# Altium footprint library ICs.PcbLib: 86 footprints (part 3 of 6)
Each footprint in its own frame and in the unit in brackets; x right, y up, seen from the top. Pads: shape width x height; smd on the part's side, far side on the other; paste and mask are expansions set on the pad; w line width, h text height; cw(c..) or ccw(c..) is an arc to the next point about the centre after c.
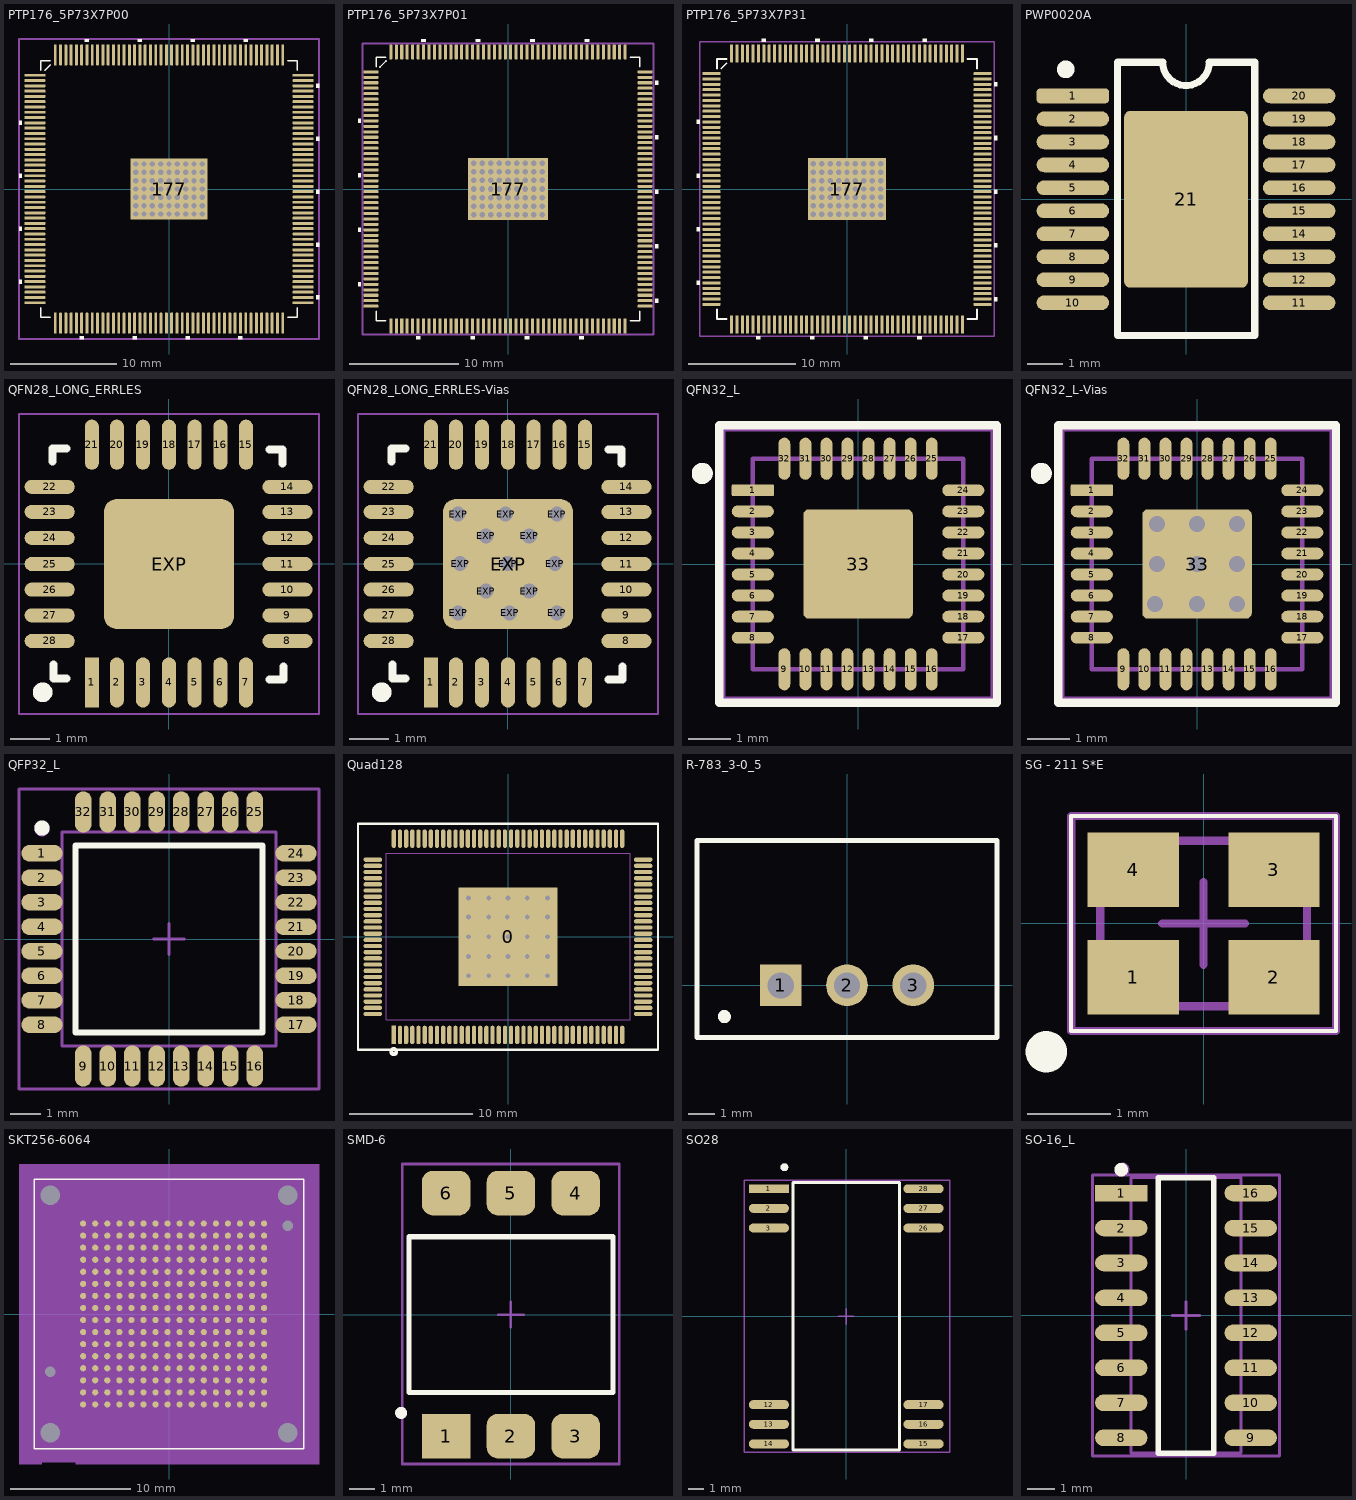
[diagram p2: the footprints below, top view; thin cyan lines are the x and y axes]

## PTP176_5P73X7P00 [mil]
pads (240):
  rect 78x11 smd: 1(-499,423.23)
  rrect50% 78x11 smd: 2(-499,403.54) 3(-499,383.86) 4(-499,364.17) 5(-499,344.49) 6(-499,324.8) 7(-499,305.12) 8(-499,285.43) 9(-499,265.75) 10(-499,246.06) 11(-499,226.38) 12(-499,206.69) 13(-499,187.01) 14(-499,167.32) 15(-499,147.64) 16(-499,127.95) 17(-499,108.27) 18(-499,88.58) 19(-499,68.9) 20(-499,49.21) 21(-499,29.53) 22(-499,9.84) 23(-499,-9.84) 24(-499,-29.53) 25(-499,-49.21) 26(-499,-68.9) 27(-499,-88.58) 28(-499,-108.27) 29(-499,-127.95) 30(-499,-147.64) 31(-499,-167.32) 32(-499,-187.01) 33(-499,-206.69) 34(-499,-226.38) 35(-499,-246.06) 36(-499,-265.75) 37(-499,-285.43) 38(-499,-305.12) 39(-499,-324.8) 40(-499,-344.49) 41(-499,-364.17) 42(-499,-383.86) 43(-499,-403.54) 44(-499,-423.23) 89(499,-423.23) 90(499,-403.54) 91(499,-383.86) 92(499,-364.17) 93(499,-344.49) 94(499,-324.8) 95(499,-305.12) 96(499,-285.43) 97(499,-265.75) 98(499,-246.06) 99(499,-226.38) 100(499,-206.69) 101(499,-187.01) 102(499,-167.32) 103(499,-147.64) 104(499,-127.95) 105(499,-108.27) 106(499,-88.58) 107(499,-68.9) 108(499,-49.21) 109(499,-29.53) 110(499,-9.84) 111(499,9.84) 112(499,29.53) 113(499,49.21) 114(499,68.9) 115(499,88.58) 116(499,108.27) 117(499,127.95) 118(499,147.64) 119(499,167.32) 120(499,187.01) 121(499,206.69) 122(499,226.38) 123(499,246.06) 124(499,265.75) 125(499,285.43) 126(499,305.12) 127(499,324.8) 128(499,344.49) 129(499,364.17) 130(499,383.86) 131(499,403.54) 132(499,423.23)
  rrect50% 11x78 smd: 45(-423.23,-499) 46(-403.54,-499) 47(-383.86,-499) 48(-364.17,-499) 49(-344.49,-499) 50(-324.8,-499) 51(-305.12,-499) 52(-285.43,-499) 53(-265.75,-499) 54(-246.06,-499) 55(-226.38,-499) 56(-206.69,-499) 57(-187.01,-499) 58(-167.32,-499) 59(-147.64,-499) 60(-127.95,-499) 61(-108.27,-499) 62(-88.58,-499) 63(-68.9,-499) 64(-49.21,-499) 65(-29.53,-499) 66(-9.84,-499) 67(9.84,-499) 68(29.53,-499) 69(49.21,-499) 70(68.9,-499) 71(88.58,-499) 72(108.27,-499) 73(127.95,-499) 74(147.64,-499) 75(167.32,-499) 76(187.01,-499) 77(206.69,-499) 78(226.38,-499) 79(246.06,-499) 80(265.75,-499) 81(285.43,-499) 82(305.12,-499) 83(324.8,-499) 84(344.49,-499) 85(364.17,-499) 86(383.86,-499) 87(403.54,-499) 88(423.23,-499) 133(423.23,499) 134(403.54,499) 135(383.86,499) 136(364.17,499) 137(344.49,499) 138(324.8,499) 139(305.12,499) 140(285.43,499) 141(265.75,499) 142(246.06,499) 143(226.38,499) 144(206.69,499) 145(187.01,499) 146(167.32,499) 147(147.64,499) 148(127.95,499) 149(108.27,499) 150(88.58,499) 151(68.9,499) 152(49.21,499) 153(29.53,499) 154(9.84,499) 155(-9.84,499) 156(-29.53,499) 157(-49.21,499) 158(-68.9,499) 159(-88.58,499) 160(-108.27,499) 161(-127.95,499) 162(-147.64,499) 163(-167.32,499) 164(-187.01,499) 165(-206.69,499) 166(-226.38,499) 167(-246.06,499) 168(-265.75,499) 169(-285.43,499) 170(-305.12,499) 171(-324.8,499) 172(-344.49,499) 173(-364.17,499) 174(-383.86,499) 175(-403.54,499) 176(-423.23,499)
  rect 287.8x225.59 smd paste-143.4 mask-143.5: 177(0,0)
  round 20 / inner round 60 / far side round 20 hole 20: V(-124,-93) V(-124,-62) V(-124,-31) V(-124,0) V(-124,31) V(-124,62) V(-124,93) V(-93,-93) V(-93,-62) V(-93,-31) V(-93,0) V(-93,31) V(-93,62) V(-93,93) V(-62,-93) V(-62,-62) V(-62,-31) V(-62,0) V(-62,31) V(-62,62) V(-62,93) V(-31,-93) V(-31,-62) V(-31,-31) V(-31,0) V(-31,31) V(-31,62) V(-31,93) V(0,-93) V(0,-62) V(0,-31) V(0,0) V(0,31) V(0,62) V(0,93) V(31,-93) V(31,-62) V(31,-31) V(31,0) V(31,31) V(31,62) V(31,93) V(62,-93) V(62,-62) V(62,-31) V(62,0) V(62,31) V(62,62) V(62,93) V(93,-93) V(93,-62) V(93,-31) V(93,0) V(93,31) V(93,62) V(93,93) V(124,-93) V(124,-62) V(124,-31) V(124,0) V(124,31) V(124,62) V(124,93)
Top Overlay:
  region: -297.62,548 -312.62,548 -312.62,558 -297.62,558
  region: -100.77,548 -115.77,548 -115.77,558 -100.77,558
  region: 96.08,548 81.08,548 81.08,558 96.08,558
  region: 292.93,548 277.93,548 277.93,558 292.93,558
  region: 548,391.36 558,391.36 558,376.36 548,376.36
  region: 548,194.51 558,194.51 558,179.51 548,179.51
  region: 548,-2.34 558,-2.34 558,-17.34 548,-17.34
  region: 548,-199.19 558,-199.19 558,-214.19 548,-214.19
  region: 548,-396.04 558,-396.04 558,-411.04 548,-411.04
  region: 273.25,-548 258.25,-548 258.25,-558 273.25,-558
  region: 76.4,-548 61.4,-548 61.4,-558 76.4,-558
  region: -120.45,-548 -135.45,-548 -135.45,-558 -120.45,-558
  region: -317.3,-548 -332.3,-548 -332.3,-558 -317.3,-558
  region: -548,-336.99 -558,-336.99 -558,-351.99 -548,-351.99
  region: -548,-140.14 -558,-140.14 -558,-155.14 -548,-155.14
  region: -548,56.71 -558,56.71 -558,41.71 -548,41.71
  region: -548,253.56 -558,253.56 -558,238.56 -548,238.56
  lines w6: -476.5,-441.83 -476.5,-476.5 -441.83,-476.5 ; -476.5,441.83 -476.5,476.5 -441.83,476.5 ; -461.17,441.83 -441.83,461.17 ; 441.83,-476.5 476.5,-476.5 476.5,-441.83 ; 441.83,476.5 476.5,476.5 476.5,441.83
Top Paste:
  drawing of 80 lines, arcs and shapes, not listed
Top Solder:
  region: 131.87,-115.3 131.87,115.3 146.4,115.3 146.4,-115.3
  region: 116.13,-115.3 116.13,115.3 100.87,115.3 100.87,-115.3
  region: 85.13,-115.3 85.13,115.3 69.87,115.3 69.87,-115.3
  region: 54.13,-115.3 54.13,115.3 38.87,115.3 38.87,-115.3
  region: 23.13,-115.3 23.13,115.3 7.87,115.3 7.87,-115.3
  region: -7.87,-115.3 -7.87,115.3 -23.13,115.3 -23.13,-115.3
  region: -38.87,-115.3 -38.87,115.3 -54.13,115.3 -54.13,-115.3
  region: -69.87,-115.3 -69.87,115.3 -85.13,115.3 -85.13,-115.3
  region: -100.87,-115.3 -100.87,115.3 -116.13,115.3 -116.13,-115.3
  region: -146.4,-115.3 -146.4,115.3 -131.87,115.3 -131.87,-115.3
  region: -146.4,-115.3 -146.4,-100.87 146.4,-100.87 146.4,-115.3
  region: -146.4,-85.13 -146.4,-69.87 146.4,-69.87 146.4,-85.13
  region: -146.4,-54.13 -146.4,-38.87 146.4,-38.87 146.4,-54.13
  region: -146.4,-23.13 -146.4,-7.87 146.4,-7.87 146.4,-23.13
  region: -146.4,7.87 -146.4,23.13 146.4,23.13 146.4,7.87
  region: -146.4,38.87 -146.4,54.13 146.4,54.13 146.4,38.87
  region: -146.4,69.87 -146.4,85.13 146.4,85.13 146.4,69.87
  region: -146.4,100.87 -146.4,115.3 146.4,115.3 146.4,100.87
Mechanical 15:
  lines w6: -558,-558 558,-558 558,558 -558,558 -558,-558
3D body "User Library-IPC QFP-full (1).step": height 66.93, standoff 3.94, extent -512.36,-512.36 512.37,512.37

## PTP176_5P73X7P01 [mil]
pads (240):
  rect 54x11 smd: 1(-495,423.23)
  rrect50% 54x11 smd: 2(-495,403.54) 3(-495,383.86) 4(-495,364.17) 5(-495,344.49) 6(-495,324.8) 7(-495,305.12) 8(-495,285.43) 9(-495,265.75) 10(-495,246.06) 11(-495,226.38) 12(-495,206.69) 13(-495,187.01) 14(-495,167.32) 15(-495,147.64) 16(-495,127.95) 17(-495,108.27) 18(-495,88.58) 19(-495,68.9) 20(-495,49.21) 21(-495,29.53) 22(-495,9.84) 23(-495,-9.84) 24(-495,-29.53) 25(-495,-49.21) 26(-495,-68.9) 27(-495,-88.58) 28(-495,-108.27) 29(-495,-127.95) 30(-495,-147.64) 31(-495,-167.32) 32(-495,-187.01) 33(-495,-206.69) 34(-495,-226.38) 35(-495,-246.06) 36(-495,-265.75) 37(-495,-285.43) 38(-495,-305.12) 39(-495,-324.8) 40(-495,-344.49) 41(-495,-364.17) 42(-495,-383.86) 43(-495,-403.54) 44(-495,-423.23) 89(495,-423.23) 90(495,-403.54) 91(495,-383.86) 92(495,-364.17) 93(495,-344.49) 94(495,-324.8) 95(495,-305.12) 96(495,-285.43) 97(495,-265.75) 98(495,-246.06) 99(495,-226.38) 100(495,-206.69) 101(495,-187.01) 102(495,-167.32) 103(495,-147.64) 104(495,-127.95) 105(495,-108.27) 106(495,-88.58) 107(495,-68.9) 108(495,-49.21) 109(495,-29.53) 110(495,-9.84) 111(495,9.84) 112(495,29.53) 113(495,49.21) 114(495,68.9) 115(495,88.58) 116(495,108.27) 117(495,127.95) 118(495,147.64) 119(495,167.32) 120(495,187.01) 121(495,206.69) 122(495,226.38) 123(495,246.06) 124(495,265.75) 125(495,285.43) 126(495,305.12) 127(495,324.8) 128(495,344.49) 129(495,364.17) 130(495,383.86) 131(495,403.54) 132(495,423.23)
  rect 11x54 smd: 45(-423.23,-495) 46(-403.54,-495) 47(-383.86,-495) 48(-364.17,-495) 49(-344.49,-495) 50(-324.8,-495) 51(-305.12,-495) 52(-285.43,-495) 53(-265.75,-495) 54(-246.06,-495) 55(-226.38,-495) 56(-206.69,-495) 57(-187.01,-495) 58(-167.32,-495) 59(-147.64,-495) 60(-127.95,-495) 61(-108.27,-495) 62(-88.58,-495) 63(-68.9,-495) 64(-49.21,-495) 65(-29.53,-495) 66(-9.84,-495) 67(9.84,-495) 68(29.53,-495) 69(49.21,-495) 70(68.9,-495) 71(88.58,-495) 72(108.27,-495) 73(127.95,-495) 74(147.64,-495) 75(167.32,-495) 76(187.01,-495) 77(206.69,-495) 78(226.38,-495) 79(246.06,-495) 80(265.75,-495) 81(285.43,-495) 82(305.12,-495) 83(324.8,-495) 84(344.49,-495) 85(364.17,-495) 86(383.86,-495) 87(403.54,-495) 88(423.23,-495)
  rrect50% 11x54 smd: 133(423.23,495) 134(403.54,495) 135(383.86,495) 136(364.17,495) 137(344.49,495) 138(324.8,495) 139(305.12,495) 140(285.43,495) 141(265.75,495) 142(246.06,495) 143(226.38,495) 144(206.69,495) 145(187.01,495) 146(167.32,495) 147(147.64,495) 148(127.95,495) 149(108.27,495) 150(88.58,495) 151(68.9,495) 152(49.21,495) 153(29.53,495) 154(9.84,495) 155(-9.84,495) 156(-29.53,495) 157(-49.21,495) 158(-68.9,495) 159(-88.58,495) 160(-108.27,495) 161(-127.95,495) 162(-147.64,495) 163(-167.32,495) 164(-187.01,495) 165(-206.69,495) 166(-226.38,495) 167(-246.06,495) 168(-265.75,495) 169(-285.43,495) 170(-305.12,495) 171(-324.8,495) 172(-344.49,495) 173(-364.17,495) 174(-383.86,495) 175(-403.54,495) 176(-423.23,495)
  rect 287.8x225.59 smd paste-143.4 mask-143.5: 177(0,0)
  round 20 / inner round 60 / far side round 20 hole 20: V(-124,-93) V(-124,-62) V(-124,-31) V(-124,0) V(-124,31) V(-124,62) V(-124,93) V(-93,-93) V(-93,-62) V(-93,-31) V(-93,0) V(-93,31) V(-93,62) V(-93,93) V(-62,-93) V(-62,-62) V(-62,-31) V(-62,0) V(-62,31) V(-62,62) V(-62,93) V(-31,-93) V(-31,-62) V(-31,-31) V(-31,0) V(-31,31) V(-31,62) V(-31,93) V(0,-93) V(0,-62) V(0,-31) V(0,0) V(0,31) V(0,62) V(0,93) V(31,-93) V(31,-62) V(31,-31) V(31,0) V(31,31) V(31,62) V(31,93) V(62,-93) V(62,-62) V(62,-31) V(62,0) V(62,31) V(62,62) V(62,93) V(93,-93) V(93,-62) V(93,-31) V(93,0) V(93,31) V(93,62) V(93,93) V(124,-93) V(124,-62) V(124,-31) V(124,0) V(124,31) V(124,62) V(124,93)
Top Overlay:
  region: -297.62,532 -312.62,532 -312.62,542 -297.62,542
  region: -100.77,532 -115.77,532 -115.77,542 -100.77,542
  region: 96.08,532 81.08,532 81.08,542 96.08,542
  region: 292.93,532 277.93,532 277.93,542 292.93,542
  region: 532,391.36 542,391.36 542,376.36 532,376.36
  region: 532,194.51 542,194.51 542,179.51 532,179.51
  region: 532,-2.34 542,-2.34 542,-17.34 532,-17.34
  region: 532,-199.19 542,-199.19 542,-214.19 532,-214.19
  region: 532,-396.04 542,-396.04 542,-411.04 532,-411.04
  region: 273.25,-532 258.25,-532 258.25,-542 273.25,-542
  region: 76.4,-532 61.4,-532 61.4,-542 76.4,-542
  region: -120.45,-532 -135.45,-532 -135.45,-542 -120.45,-542
  region: -317.3,-532 -332.3,-532 -332.3,-542 -317.3,-542
  region: -532,-336.99 -542,-336.99 -542,-351.99 -532,-351.99
  region: -532,-140.14 -542,-140.14 -542,-155.14 -532,-155.14
  region: -532,56.71 -542,56.71 -542,41.71 -532,41.71
  region: -532,253.56 -542,253.56 -542,238.56 -532,238.56
  lines w6: -476.5,-441.83 -476.5,-476.5 -441.83,-476.5 ; -476.5,441.83 -476.5,476.5 -441.83,476.5 ; -462.42,440.58 -440.58,462.42 ; 441.83,-476.5 476.5,-476.5 476.5,-441.83 ; 441.83,476.5 476.5,476.5 476.5,441.83
Top Paste:
  drawing of 80 lines, arcs and shapes, not listed
Top Solder:
  region: 131.87,-115.3 131.87,115.3 146.4,115.3 146.4,-115.3
  region: 116.13,-115.3 116.13,115.3 100.87,115.3 100.87,-115.3
  region: 85.13,-115.3 85.13,115.3 69.87,115.3 69.87,-115.3
  region: 54.13,-115.3 54.13,115.3 38.87,115.3 38.87,-115.3
  region: 23.13,-115.3 23.13,115.3 7.87,115.3 7.87,-115.3
  region: -7.87,-115.3 -7.87,115.3 -23.13,115.3 -23.13,-115.3
  region: -38.87,-115.3 -38.87,115.3 -54.13,115.3 -54.13,-115.3
  region: -69.87,-115.3 -69.87,115.3 -85.13,115.3 -85.13,-115.3
  region: -100.87,-115.3 -100.87,115.3 -116.13,115.3 -116.13,-115.3
  region: -146.4,-115.3 -146.4,115.3 -131.87,115.3 -131.87,-115.3
  region: -146.4,-115.3 -146.4,-100.87 146.4,-100.87 146.4,-115.3
  region: -146.4,-85.13 -146.4,-69.87 146.4,-69.87 146.4,-85.13
  region: -146.4,-54.13 -146.4,-38.87 146.4,-38.87 146.4,-54.13
  region: -146.4,-23.13 -146.4,-7.87 146.4,-7.87 146.4,-23.13
  region: -146.4,7.87 -146.4,23.13 146.4,23.13 146.4,7.87
  region: -146.4,38.87 -146.4,54.13 146.4,54.13 146.4,38.87
  region: -146.4,69.87 -146.4,85.13 146.4,85.13 146.4,69.87
  region: -146.4,100.87 -146.4,115.3 146.4,115.3 146.4,100.87
Mechanical 15:
  lines w6: -526,-526 526,-526 526,526 -526,526 -526,-526
3D body "User Library-IPC QFP-full (1).step": height 66.93, standoff 3.94, extent -515.9,-511.37 508.82,513.35

## PTP176_5P73X7P31 [mil]
pads (240):
  rect 66x11 smd: 1(-497,423.23)
  rrect50% 66x11 smd: 2(-497,403.54) 3(-497,383.86) 4(-497,364.17) 5(-497,344.49) 6(-497,324.8) 7(-497,305.12) 8(-497,285.43) 9(-497,265.75) 10(-497,246.06) 11(-497,226.38) 12(-497,206.69) 13(-497,187.01) 14(-497,167.32) 15(-497,147.64) 16(-497,127.95) 17(-497,108.27) 18(-497,88.58) 19(-497,68.9) 20(-497,49.21) 21(-497,29.53) 22(-497,9.84) 23(-497,-9.84) 24(-497,-29.53) 25(-497,-49.21) 26(-497,-68.9) 27(-497,-88.58) 28(-497,-108.27) 29(-497,-127.95) 30(-497,-147.64) 31(-497,-167.32) 32(-497,-187.01) 33(-497,-206.69) 34(-497,-226.38) 35(-497,-246.06) 36(-497,-265.75) 37(-497,-285.43) 38(-497,-305.12) 39(-497,-324.8) 40(-497,-344.49) 41(-497,-364.17) 42(-497,-383.86) 43(-497,-403.54) 44(-497,-423.23) 89(497,-423.23) 90(497,-403.54) 91(497,-383.86) 92(497,-364.17) 93(497,-344.49) 94(497,-324.8) 95(497,-305.12) 96(497,-285.43) 97(497,-265.75) 98(497,-246.06) 99(497,-226.38) 100(497,-206.69) 101(497,-187.01) 102(497,-167.32) 103(497,-147.64) 104(497,-127.95) 105(497,-108.27) 106(497,-88.58) 107(497,-68.9) 108(497,-49.21) 109(497,-29.53) 110(497,-9.84) 111(497,9.84) 112(497,29.53) 113(497,49.21) 114(497,68.9) 115(497,88.58) 116(497,108.27) 117(497,127.95) 118(497,147.64) 119(497,167.32) 120(497,187.01) 121(497,206.69) 122(497,226.38) 123(497,246.06) 124(497,265.75) 125(497,285.43) 126(497,305.12) 127(497,324.8) 128(497,344.49) 129(497,364.17) 130(497,383.86) 131(497,403.54) 132(497,423.23)
  rect 11x66 smd: 45(-423.23,-497) 46(-403.54,-497) 47(-383.86,-497) 48(-364.17,-497) 49(-344.49,-497) 50(-324.8,-497) 51(-305.12,-497) 52(-285.43,-497) 53(-265.75,-497) 54(-246.06,-497) 55(-226.38,-497) 56(-206.69,-497) 57(-187.01,-497) 58(-167.32,-497) 59(-147.64,-497) 60(-127.95,-497) 61(-108.27,-497) 62(-88.58,-497) 63(-68.9,-497) 64(-49.21,-497) 65(-29.53,-497) 66(-9.84,-497) 67(9.84,-497) 68(29.53,-497) 69(49.21,-497) 70(68.9,-497) 71(88.58,-497) 72(108.27,-497) 73(127.95,-497) 74(147.64,-497) 75(167.32,-497) 76(187.01,-497) 77(206.69,-497) 78(226.38,-497) 79(246.06,-497) 80(265.75,-497) 81(285.43,-497) 82(305.12,-497) 83(324.8,-497) 84(344.49,-497) 85(364.17,-497) 86(383.86,-497) 87(403.54,-497) 88(423.23,-497)
  rrect50% 11x66 smd: 133(423.23,497) 134(403.54,497) 135(383.86,497) 136(364.17,497) 137(344.49,497) 138(324.8,497) 139(305.12,497) 140(285.43,497) 141(265.75,497) 142(246.06,497) 143(226.38,497) 144(206.69,497) 145(187.01,497) 146(167.32,497) 147(147.64,497) 148(127.95,497) 149(108.27,497) 150(88.58,497) 151(68.9,497) 152(49.21,497) 153(29.53,497) 154(9.84,497) 155(-9.84,497) 156(-29.53,497) 157(-49.21,497) 158(-68.9,497) 159(-88.58,497) 160(-108.27,497) 161(-127.95,497) 162(-147.64,497) 163(-167.32,497) 164(-187.01,497) 165(-206.69,497) 166(-226.38,497) 167(-246.06,497) 168(-265.75,497) 169(-285.43,497) 170(-305.12,497) 171(-324.8,497) 172(-344.49,497) 173(-364.17,497) 174(-383.86,497) 175(-403.54,497) 176(-423.23,497)
  rect 287.8x225.59 smd paste-143.4 mask-143.5: 177(0,0)
  round 20 / inner round 60 / far side round 20 hole 20: V(-124,-93) V(-124,-62) V(-124,-31) V(-124,0) V(-124,31) V(-124,62) V(-124,93) V(-93,-93) V(-93,-62) V(-93,-31) V(-93,0) V(-93,31) V(-93,62) V(-93,93) V(-62,-93) V(-62,-62) V(-62,-31) V(-62,0) V(-62,31) V(-62,62) V(-62,93) V(-31,-93) V(-31,-62) V(-31,-31) V(-31,0) V(-31,31) V(-31,62) V(-31,93) V(0,-93) V(0,-62) V(0,-31) V(0,0) V(0,31) V(0,62) V(0,93) V(31,-93) V(31,-62) V(31,-31) V(31,0) V(31,31) V(31,62) V(31,93) V(62,-93) V(62,-62) V(62,-31) V(62,0) V(62,31) V(62,62) V(62,93) V(93,-93) V(93,-62) V(93,-31) V(93,0) V(93,31) V(93,62) V(93,93) V(124,-93) V(124,-62) V(124,-31) V(124,0) V(124,31) V(124,62) V(124,93)
Top Overlay:
  region: -540,253.56 -550,253.56 -550,238.56 -540,238.56
  region: -540,56.71 -550,56.71 -550,41.71 -540,41.71
  region: -540,-140.14 -550,-140.14 -550,-155.14 -540,-155.14
  region: -540,-336.99 -550,-336.99 -550,-351.99 -540,-351.99
  region: -317.3,-540 -332.3,-540 -332.3,-550 -317.3,-550
  region: -120.45,-540 -135.45,-540 -135.45,-550 -120.45,-550
  region: 76.4,-540 61.4,-540 61.4,-550 76.4,-550
  region: 273.25,-540 258.25,-540 258.25,-550 273.25,-550
  region: 540,-396.04 550,-396.04 550,-411.04 540,-411.04
  region: 540,-199.19 550,-199.19 550,-214.19 540,-214.19
  region: 540,-2.34 550,-2.34 550,-17.34 540,-17.34
  region: 540,194.51 550,194.51 550,179.51 540,179.51
  region: 540,391.36 550,391.36 550,376.36 540,376.36
  region: 292.93,540 277.93,540 277.93,550 292.93,550
  region: 96.08,540 81.08,540 81.08,550 96.08,550
  region: -100.77,540 -115.77,540 -115.77,550 -100.77,550
  region: -297.62,540 -312.62,540 -312.62,550 -297.62,550
  lines w6: -476.5,-441.83 -476.5,-476.5 -441.83,-476.5 ; -476.5,441.83 -476.5,476.5 -441.83,476.5 ; -461.43,441.57 -441.57,461.43 ; 441.83,-476.5 476.5,-476.5 476.5,-441.83 ; 441.83,476.5 476.5,476.5 476.5,441.83
Top Paste:
  drawing of 80 lines, arcs and shapes, not listed
Top Solder:
  region: -146.4,100.87 -146.4,115.3 146.4,115.3 146.4,100.87
  region: -146.4,69.87 -146.4,85.13 146.4,85.13 146.4,69.87
  region: -146.4,38.87 -146.4,54.13 146.4,54.13 146.4,38.87
  region: -146.4,7.87 -146.4,23.13 146.4,23.13 146.4,7.87
  region: -146.4,-23.13 -146.4,-7.87 146.4,-7.87 146.4,-23.13
  region: -146.4,-54.13 -146.4,-38.87 146.4,-38.87 146.4,-54.13
  region: -146.4,-85.13 -146.4,-69.87 146.4,-69.87 146.4,-85.13
  region: -146.4,-115.3 -146.4,-100.87 146.4,-100.87 146.4,-115.3
  region: -146.4,-115.3 -146.4,115.3 -131.87,115.3 -131.87,-115.3
  region: -100.87,-115.3 -100.87,115.3 -116.13,115.3 -116.13,-115.3
  region: -69.87,-115.3 -69.87,115.3 -85.13,115.3 -85.13,-115.3
  region: -38.87,-115.3 -38.87,115.3 -54.13,115.3 -54.13,-115.3
  region: -7.87,-115.3 -7.87,115.3 -23.13,115.3 -23.13,-115.3
  region: 23.13,-115.3 23.13,115.3 7.87,115.3 7.87,-115.3
  region: 54.13,-115.3 54.13,115.3 38.87,115.3 38.87,-115.3
  region: 85.13,-115.3 85.13,115.3 69.87,115.3 69.87,-115.3
  region: 116.13,-115.3 116.13,115.3 100.87,115.3 100.87,-115.3
  region: 131.87,-115.3 131.87,115.3 146.4,115.3 146.4,-115.3
Mechanical 15:
  lines w6: -540,-540 -540,540 540,540 540,-540 -540,-540
3D body "User Library-IPC QFP-full (1).step": height 66.93, standoff 3.94, extent -512.36,-512.35 512.37,512.37

## PWP0020A [mm] "PWP0020A"
height 1.75
pads (21):
  rrect50% 2.05x0.42 smd: 1(-3.2,2.925)
  oval 2.05x0.42 smd: 2(-3.2,2.275) 3(-3.2,1.625) 4(-3.2,0.975) 5(-3.2,0.325) 6(-3.2,-0.325) 7(-3.2,-0.975) 8(-3.2,-1.625) 9(-3.2,-2.275) 10(-3.2,-2.925) 11(3.2,-2.925) 12(3.2,-2.275) 13(3.2,-1.625) 14(3.2,-0.975) 15(3.2,-0.325) 16(3.2,0.325) 17(3.2,0.975) 18(3.2,1.625) 19(3.2,2.275) 20(3.2,2.925)
  rrect10% 3.5x5 smd: 21(0,0)
Top Overlay:
  circle w0.25: c-3.4,3.675 r0.125
  lines w0.2: -1.94,-3.85 -1.94,3.875 -0.658,3.875 ccw(c0,3.875) 0.658,3.875 1.945,3.875 1.945,-3.85 -1.94,-3.85
Mechanical 15:
  lines w0.05: -0.25,-1.3 0.25,-1.3 ; 0,-1.55 0,-1.05
3D body: height 1.75, standoff 0.05, extent -2.15,-3.875 2.15,3.85
